# Altium schematic symbol library jlcpcb_2025_04_capacitors_extended_0603.schlib: 3668 symbols (part 5 of 20) (continued)
## 0603N750G500CT
designator C?  Capacitance: 75pF  (hidden comment: *)
Capacitor, Ceramic (MLCC), 75pF, ±2%, 50V, NP0, ±2%, SMD 0603; Manufacturer: Walsin Tech Corp; Manufacturer Part Number: 0603N750G500CT; Package Size: 0603; JLCPCB Basic Part: No; JLCPCB Part Number: C303829; Supplier 1: LCSC; Category: Capacitors - MLCC; Supplier Part Number 1: C303829; Tolerance: ±2%; Voltage Rating: 50V; Temperature Coefficient: NP0; RoHS: Yes; ComponentLink1Description: Datasheet; ComponentLink1URL: https://wmsc.lcsc.com/wmsc/upload/file/pdf/v2/lcsc/2304140030_Walsin-Tech-Corp-0603N750G500CT_C303829.pdf; ComponentLink2Description: JLCPCB Part URL; ComponentLink2URL: https://jlcpcb.com/partdetail/C303829; ComponentLink3Description: LCSC Part URL; ComponentLink3URL: https://lcsc.com/product-detail/Multilayer-Ceramic-Capacitors-MLCC---SMD-SMT_Walsin-Tech-Corp-Walsin-Tech-Corp-0603N750G500CT_C303829.html
footprint CAP-0603 (0603 (1608M) Capacitor)
pins: 1, 2

## 0603N751J500CT
designator C?  Capacitance: 750pF  (hidden comment: *)
Capacitor, Ceramic (MLCC), 750pF, ±5%, 50V, NP0, ±5%, SMD 0603; Manufacturer: Walsin Tech Corp; Manufacturer Part Number: 0603N751J500CT; Package Size: 0603; JLCPCB Basic Part: No; JLCPCB Part Number: C575469; Supplier 1: LCSC; Category: Capacitors - MLCC; Supplier Part Number 1: C575469; Tolerance: ±5%; Voltage Rating: 50V; Temperature Coefficient: NP0; RoHS: Yes; ComponentLink1Description: Datasheet; ComponentLink1URL: https://wmsc.lcsc.com/wmsc/upload/file/pdf/v2/lcsc/2304140030_Walsin-Tech-Corp-0603N751J500CT_C575469.pdf; ComponentLink2Description: JLCPCB Part URL; ComponentLink2URL: https://jlcpcb.com/partdetail/C575469; ComponentLink3Description: LCSC Part URL; ComponentLink3URL: https://lcsc.com/product-detail/Multilayer-Ceramic-Capacitors-MLCC---SMD-SMT_Walsin-Tech-Corp-Walsin-Tech-Corp-0603N751J500CT_C575469.html
footprint CAP-0603 (0603 (1608M) Capacitor)
pins: 1, 2

## 0603N820F101CT
designator C?  Capacitance: 82pF  (hidden comment: *)
Capacitor, Ceramic (MLCC), 82pF, ±1%, 100V, NP0, ±1%, SMD 0603; Manufacturer: Walsin Tech Corp; Manufacturer Part Number: 0603N820F101CT; Package Size: 0603; JLCPCB Basic Part: No; JLCPCB Part Number: C388063; Supplier 1: LCSC; Category: Capacitors - MLCC; Supplier Part Number 1: C388063; Tolerance: ±1%; Voltage Rating: 100V; Temperature Coefficient: NP0; RoHS: Yes; ComponentLink1Description: Datasheet; ComponentLink1URL: https://wmsc.lcsc.com/wmsc/upload/file/pdf/v2/lcsc/2304140030_Walsin-Tech-Corp-0603N820F101CT_C388063.pdf; ComponentLink2Description: JLCPCB Part URL; ComponentLink2URL: https://jlcpcb.com/partdetail/C388063; ComponentLink3Description: LCSC Part URL; ComponentLink3URL: https://lcsc.com/product-detail/Multilayer-Ceramic-Capacitors-MLCC---SMD-SMT_Walsin-Tech-Corp-Walsin-Tech-Corp-0603N820F101CT_C388063.html
footprint CAP-0603 (0603 (1608M) Capacitor)
pins: 1, 2

## 0603N820G500CT
designator C?  Capacitance: 82pF  (hidden comment: *)
Capacitor, Ceramic (MLCC), 82pF, ±2%, 50V, NP0, ±2%, SMD 0603; Manufacturer: Walsin Tech Corp; Manufacturer Part Number: 0603N820G500CT; Package Size: 0603; JLCPCB Basic Part: No; JLCPCB Part Number: C388064; Supplier 1: LCSC; Category: Capacitors - MLCC; Supplier Part Number 1: C388064; Tolerance: ±2%; Voltage Rating: 50V; Temperature Coefficient: NP0; RoHS: Yes; ComponentLink1Description: Datasheet; ComponentLink1URL: https://wmsc.lcsc.com/wmsc/upload/file/pdf/v2/lcsc/2304140030_Walsin-Tech-Corp-0603N820G500CT_C388064.pdf; ComponentLink2Description: JLCPCB Part URL; ComponentLink2URL: https://jlcpcb.com/partdetail/C388064; ComponentLink3Description: LCSC Part URL; ComponentLink3URL: https://lcsc.com/product-detail/Multilayer-Ceramic-Capacitors-MLCC---SMD-SMT_Walsin-Tech-Corp-Walsin-Tech-Corp-0603N820G500CT_C388064.html
footprint CAP-0603 (0603 (1608M) Capacitor)
pins: 1, 2

## 0603N820J251CT
designator C?  Capacitance: 82pF  (hidden comment: *)
Capacitor, Ceramic (MLCC), 82pF, ±5%, 250V, NP0, ±5%, SMD 0603; Manufacturer: Walsin Tech Corp; Manufacturer Part Number: 0603N820J251CT; Package Size: 0603; JLCPCB Basic Part: No; JLCPCB Part Number: C388065; Supplier 1: LCSC; Category: Capacitors - MLCC; Supplier Part Number 1: C388065; Tolerance: ±5%; Voltage Rating: 250V; Temperature Coefficient: NP0; RoHS: Yes; ComponentLink1Description: Datasheet; ComponentLink1URL: https://wmsc.lcsc.com/wmsc/upload/file/pdf/v2/lcsc/2304140030_Walsin-Tech-Corp-0603N820J251CT_C388065.pdf; ComponentLink2Description: JLCPCB Part URL; ComponentLink2URL: https://jlcpcb.com/partdetail/C388065; ComponentLink3Description: LCSC Part URL; ComponentLink3URL: https://lcsc.com/product-detail/Multilayer-Ceramic-Capacitors-MLCC---SMD-SMT_Walsin-Tech-Corp-Walsin-Tech-Corp-0603N820J251CT_C388065.html
footprint CAP-0603 (0603 (1608M) Capacitor)
pins: 1, 2

## 0603N820J500CT
designator C?  Capacitance: 82pF  (hidden comment: *)
Capacitor, Ceramic (MLCC), 82pF, ±5%, 50V, NP0, ±5%, SMD 0603; Manufacturer: Walsin Tech Corp; Manufacturer Part Number: 0603N820J500CT; Package Size: 0603; JLCPCB Basic Part: No; JLCPCB Part Number: C314304; Supplier 1: LCSC; Category: Capacitors - MLCC; Supplier Part Number 1: C314304; Tolerance: ±5%; Voltage Rating: 50V; Temperature Coefficient: NP0; RoHS: Yes; ComponentLink1Description: Datasheet; ComponentLink1URL: https://wmsc.lcsc.com/wmsc/upload/file/pdf/v2/lcsc/2304140030_Walsin-Tech-Corp-0603N820J500CT_C314304.pdf; ComponentLink2Description: JLCPCB Part URL; ComponentLink2URL: https://jlcpcb.com/partdetail/C314304; ComponentLink3Description: LCSC Part URL; ComponentLink3URL: https://lcsc.com/product-detail/Multilayer-Ceramic-Capacitors-MLCC---SMD-SMT_Walsin-Tech-Corp-Walsin-Tech-Corp-0603N820J500CT_C314304.html
footprint CAP-0603 (0603 (1608M) Capacitor)
pins: 1, 2

## 0603N820K500CT
designator C?  Capacitance: 82pF  (hidden comment: *)
Capacitor, Ceramic (MLCC), 82pF, ±10%, 50V, NP0, ±10%, SMD 0603; Manufacturer: Walsin Tech Corp; Manufacturer Part Number: 0603N820K500CT; Package Size: 0603; JLCPCB Basic Part: No; JLCPCB Part Number: C296069; Supplier 1: LCSC; Category: Capacitors - MLCC; Supplier Part Number 1: C296069; Tolerance: ±10%; Voltage Rating: 50V; Temperature Coefficient: NP0; RoHS: Yes; ComponentLink1Description: Datasheet; ComponentLink1URL: https://wmsc.lcsc.com/wmsc/upload/file/pdf/v2/lcsc/2304140030_Walsin-Tech-Corp-0603N820K500CT_C296069.pdf; ComponentLink2Description: JLCPCB Part URL; ComponentLink2URL: https://jlcpcb.com/partdetail/C296069; ComponentLink3Description: LCSC Part URL; ComponentLink3URL: https://lcsc.com/product-detail/Multilayer-Ceramic-Capacitors-MLCC---SMD-SMT_Walsin-Tech-Corp-Walsin-Tech-Corp-0603N820K500CT_C296069.html
footprint CAP-0603 (0603 (1608M) Capacitor)
pins: 1, 2

## 0603N821F500CT
designator C?  Capacitance: 820pF  (hidden comment: *)
Capacitor, Ceramic (MLCC), 820pF, ±1%, 50V, C0G, ±1%, SMD 0603; Manufacturer: Walsin Tech Corp; Manufacturer Part Number: 0603N821F500CT; Package Size: 0603; JLCPCB Basic Part: No; JLCPCB Part Number: C3888649; Supplier 1: LCSC; Category: Capacitors - MLCC; Supplier Part Number 1: C3888649; Tolerance: ±1%; Voltage Rating: 50V; Temperature Coefficient: C0G; RoHS: Yes; ComponentLink1Description: Datasheet; ComponentLink1URL: https://wmsc.lcsc.com/wmsc/upload/file/pdf/v2/lcsc/2309201536_Walsin-Tech-Corp-0603N821F500CT_C3888649.pdf; ComponentLink2Description: JLCPCB Part URL; ComponentLink2URL: https://jlcpcb.com/partdetail/C3888649; ComponentLink3Description: LCSC Part URL; ComponentLink3URL: https://lcsc.com/product-detail/Multilayer-Ceramic-Capacitors-MLCC---SMD-SMT_Walsin-Tech-Corp-Walsin-Tech-Corp-0603N821F500CT_C3888649.html
footprint CAP-0603 (0603 (1608M) Capacitor)
pins: 1, 2

## 0603N821J500CT
designator C?  Capacitance: 820pF  (hidden comment: *)
Capacitor, Ceramic (MLCC), 820pF, ±5%, 50V, NP0, ±5%, SMD 0603; Manufacturer: Walsin Tech Corp; Manufacturer Part Number: 0603N821J500CT; Package Size: 0603; JLCPCB Basic Part: No; JLCPCB Part Number: C237237; Supplier 1: LCSC; Category: Capacitors - MLCC; Supplier Part Number 1: C237237; Tolerance: ±5%; Voltage Rating: 50V; Temperature Coefficient: NP0; RoHS: Yes; ComponentLink1Description: Datasheet; ComponentLink1URL: https://wmsc.lcsc.com/wmsc/upload/file/pdf/v2/lcsc/2304140030_Walsin-Tech-Corp-0603N821J500CT_C237237.pdf; ComponentLink2Description: JLCPCB Part URL; ComponentLink2URL: https://jlcpcb.com/partdetail/C237237; ComponentLink3Description: LCSC Part URL; ComponentLink3URL: https://lcsc.com/product-detail/Multilayer-Ceramic-Capacitors-MLCC---SMD-SMT_Walsin-Tech-Corp-Walsin-Tech-Corp-0603N821J500CT_C237237.html
footprint CAP-0603 (0603 (1608M) Capacitor)
pins: 1, 2

## 0603N911J500CT
designator C?  Capacitance: 910pF  (hidden comment: *)
Capacitor, Ceramic (MLCC), 910pF, ±5%, 50V, NP0, ±5%, SMD 0603; Manufacturer: Walsin Tech Corp; Manufacturer Part Number: 0603N911J500CT; Package Size: 0603; JLCPCB Basic Part: No; JLCPCB Part Number: C458911; Supplier 1: LCSC; Category: Capacitors - MLCC; Supplier Part Number 1: C458911; Tolerance: ±5%; Voltage Rating: 50V; Temperature Coefficient: NP0; RoHS: Yes; ComponentLink1Description: Datasheet; ComponentLink1URL: https://wmsc.lcsc.com/wmsc/upload/file/pdf/v2/lcsc/2304140030_Walsin-Tech-Corp-0603N911J500CT_C458911.pdf; ComponentLink2Description: JLCPCB Part URL; ComponentLink2URL: https://jlcpcb.com/partdetail/C458911; ComponentLink3Description: LCSC Part URL; ComponentLink3URL: https://lcsc.com/product-detail/Multilayer-Ceramic-Capacitors-MLCC---SMD-SMT_Walsin-Tech-Corp-Walsin-Tech-Corp-0603N911J500CT_C458911.html
footprint CAP-0603 (0603 (1608M) Capacitor)
pins: 1, 2

## 0603X105J6R3CT
designator C?  Capacitance: 1uF  (hidden comment: *)
Capacitor, Ceramic (MLCC), 1uF, ±5%, 6.3V, X5R, ±5%, SMD 0603; Manufacturer: Walsin Tech Corp; Manufacturer Part Number: 0603X105J6R3CT; Package Size: 0603; JLCPCB Basic Part: No; JLCPCB Part Number: C458914; Supplier 1: LCSC; Category: Capacitors - MLCC; Supplier Part Number 1: C458914; Tolerance: ±5%; Voltage Rating: 6.3V; Temperature Coefficient: X5R; RoHS: Yes; ComponentLink1Description: Datasheet; ComponentLink1URL: https://wmsc.lcsc.com/wmsc/upload/file/pdf/v2/lcsc/2304140030_Walsin-Tech-Corp-0603X105J6R3CT_C458914.pdf; ComponentLink2Description: JLCPCB Part URL; ComponentLink2URL: https://jlcpcb.com/partdetail/C458914; ComponentLink3Description: LCSC Part URL; ComponentLink3URL: https://lcsc.com/product-detail/Multilayer-Ceramic-Capacitors-MLCC---SMD-SMT_Walsin-Tech-Corp-Walsin-Tech-Corp-0603X105J6R3CT_C458914.html
footprint CAP-0603 (0603 (1608M) Capacitor)
pins: 1, 2

## 0603X105J100CT
designator C?  Capacitance: 1uF  (hidden comment: *)
Capacitor, Ceramic (MLCC), 1uF, ±5%, 10V, X5R, ±5%, SMD 0603; Manufacturer: Walsin Tech Corp; Manufacturer Part Number: 0603X105J100CT; Package Size: 0603; JLCPCB Basic Part: No; JLCPCB Part Number: C458912; Supplier 1: LCSC; Category: Capacitors - MLCC; Supplier Part Number 1: C458912; Tolerance: ±5%; Voltage Rating: 10V; Temperature Coefficient: X5R; RoHS: Yes; ComponentLink1Description: Datasheet; ComponentLink1URL: https://wmsc.lcsc.com/wmsc/upload/file/pdf/v2/lcsc/2304140030_Walsin-Tech-Corp-0603X105J100CT_C458912.pdf; ComponentLink2Description: JLCPCB Part URL; ComponentLink2URL: https://jlcpcb.com/partdetail/C458912; ComponentLink3Description: LCSC Part URL; ComponentLink3URL: https://lcsc.com/product-detail/Multilayer-Ceramic-Capacitors-MLCC---SMD-SMT_Walsin-Tech-Corp-Walsin-Tech-Corp-0603X105J100CT_C458912.html
footprint CAP-0603 (0603 (1608M) Capacitor)
pins: 1, 2

## 0603X105J160CT
designator C?  Capacitance: 1uF  (hidden comment: *)
Capacitor, Ceramic (MLCC), 1uF, ±5%, 16V, X5R, ±5%, SMD 0603; Manufacturer: Walsin Tech Corp; Manufacturer Part Number: 0603X105J160CT; Package Size: 0603; JLCPCB Basic Part: No; JLCPCB Part Number: C458913; Supplier 1: LCSC; Category: Capacitors - MLCC; Supplier Part Number 1: C458913; Tolerance: ±5%; Voltage Rating: 16V; Temperature Coefficient: X5R; RoHS: Yes; ComponentLink1Description: Datasheet; ComponentLink1URL: https://wmsc.lcsc.com/wmsc/upload/file/pdf/v2/lcsc/2304140030_Walsin-Tech-Corp-0603X105J160CT_C458913.pdf; ComponentLink2Description: JLCPCB Part URL; ComponentLink2URL: https://jlcpcb.com/partdetail/C458913; ComponentLink3Description: LCSC Part URL; ComponentLink3URL: https://lcsc.com/product-detail/Multilayer-Ceramic-Capacitors-MLCC---SMD-SMT_Walsin-Tech-Corp-Walsin-Tech-Corp-0603X105J160CT_C458913.html
footprint CAP-0603 (0603 (1608M) Capacitor)
pins: 1, 2

## 0603X105K6R3CT
designator C?  Capacitance: 1uF  (hidden comment: *)
Capacitor, Ceramic (MLCC), 1uF, ±10%, 6.3V, X5R, ±10%, SMD 0603; Manufacturer: Walsin Tech Corp; Manufacturer Part Number: 0603X105K6R3CT; Package Size: 0603; JLCPCB Basic Part: No; JLCPCB Part Number: C152900; Supplier 1: LCSC; Category: Capacitors - MLCC; Supplier Part Number 1: C152900; Tolerance: ±10%; Voltage Rating: 6.3V; Temperature Coefficient: X5R; RoHS: Yes; ComponentLink1Description: Datasheet; ComponentLink1URL: https://wmsc.lcsc.com/wmsc/upload/file/pdf/v2/lcsc/2304140030_Walsin-Tech-Corp-0603X105K6R3CT_C152900.pdf; ComponentLink2Description: JLCPCB Part URL; ComponentLink2URL: https://jlcpcb.com/partdetail/C152900; ComponentLink3Description: LCSC Part URL; ComponentLink3URL: https://lcsc.com/product-detail/Multilayer-Ceramic-Capacitors-MLCC---SMD-SMT_Walsin-Tech-Corp-Walsin-Tech-Corp-0603X105K6R3CT_C152900.html
footprint CAP-0603 (0603 (1608M) Capacitor)
pins: 1, 2

## 0603X105K100CT
designator C?  Capacitance: 1uF  (hidden comment: *)
Capacitor, Ceramic (MLCC), 1uF, ±10%, 10V, X5R, ±10%, SMD 0603; Manufacturer: Walsin Tech Corp; Manufacturer Part Number: 0603X105K100CT; Package Size: 0603; JLCPCB Basic Part: No; JLCPCB Part Number: C83059; Supplier 1: LCSC; Category: Capacitors - MLCC; Supplier Part Number 1: C83059; Tolerance: ±10%; Voltage Rating: 10V; Temperature Coefficient: X5R; RoHS: Yes; ComponentLink1Description: Datasheet; ComponentLink1URL: https://wmsc.lcsc.com/wmsc/upload/file/pdf/v2/lcsc/1811151147_Walsin-Tech-Corp-0603X105K100CT_C83059.pdf; ComponentLink2Description: JLCPCB Part URL; ComponentLink2URL: https://jlcpcb.com/partdetail/C83059; ComponentLink3Description: LCSC Part URL; ComponentLink3URL: https://lcsc.com/product-detail/Multilayer-Ceramic-Capacitors-MLCC---SMD-SMT_Walsin-Tech-Corp-Walsin-Tech-Corp-0603X105K100CT_C83059.html
footprint CAP-0603 (0603 (1608M) Capacitor)
pins: 1, 2

## 0603X105K100NT
designator C?  Capacitance: 1uF  (hidden comment: *)
Capacitor, Ceramic (MLCC), 1uF, ±10%, 10V, X5R, ±10%, SMD 0603; Manufacturer: FH(Guangdong Fenghua Advanced Tech); Manufacturer Part Number: 0603X105K100NT; Package Size: 0603; JLCPCB Basic Part: No; JLCPCB Part Number: C111590; Supplier 1: LCSC; Category: Capacitors - MLCC; Supplier Part Number 1: C111590; Tolerance: ±10%; Voltage Rating: 10V; Temperature Coefficient: X5R; RoHS: Yes; ComponentLink1Description: Datasheet; ComponentLink1URL: https://wmsc.lcsc.com/wmsc/upload/file/pdf/v2/lcsc/2304140030_FH--Guangdong-Fenghua-Advanced-Tech-0603X105K100NT_C111590.pdf; ComponentLink2Description: JLCPCB Part URL; ComponentLink2URL: https://jlcpcb.com/partdetail/C111590; ComponentLink3Description: LCSC Part URL; ComponentLink3URL: https://lcsc.com/product-detail/Multilayer-Ceramic-Capacitors-MLCC---SMD-SMT_FH-Guangdong-Fenghua-Advanced-Tech-FH-Guangdong-Fenghua-Advanced-Tech-0603X105K100NT_C111590.html
footprint CAP-0603 (0603 (1608M) Capacitor)
pins: 1, 2

## 0603X105K160CT
designator C?  Capacitance: 1uF  (hidden comment: *)
Capacitor, Ceramic (MLCC), 1uF, ±10%, 16V, X5R, ±10%, SMD 0603; Manufacturer: Walsin Tech Corp; Manufacturer Part Number: 0603X105K160CT; Package Size: 0603; JLCPCB Basic Part: No; JLCPCB Part Number: C105504; Supplier 1: LCSC; Category: Capacitors - MLCC; Supplier Part Number 1: C105504; Tolerance: ±10%; Voltage Rating: 16V; Temperature Coefficient: X5R; RoHS: Yes; ComponentLink1Description: Datasheet; ComponentLink1URL: https://wmsc.lcsc.com/wmsc/upload/file/pdf/v2/lcsc/2304140030_Walsin-Tech-Corp-0603X105K160CT_C105504.pdf; ComponentLink2Description: JLCPCB Part URL; ComponentLink2URL: https://jlcpcb.com/partdetail/C105504; ComponentLink3Description: LCSC Part URL; ComponentLink3URL: https://lcsc.com/product-detail/Multilayer-Ceramic-Capacitors-MLCC---SMD-SMT_Walsin-Tech-Corp-Walsin-Tech-Corp-0603X105K160CT_C105504.html
footprint CAP-0603 (0603 (1608M) Capacitor)
pins: 1, 2

## 0603X105K160NT
designator C?  Capacitance: 1uF  (hidden comment: *)
Capacitor, Ceramic (MLCC), 1uF, ±10%, 16V, X5R, ±10%, SMD 0603; Manufacturer: FH(Guangdong Fenghua Advanced Tech); Manufacturer Part Number: 0603X105K160NT; Package Size: 0603; JLCPCB Basic Part: No; JLCPCB Part Number: C89188; Supplier 1: LCSC; Category: Capacitors - MLCC; Supplier Part Number 1: C89188; Tolerance: ±10%; Voltage Rating: 16V; Temperature Coefficient: X5R; RoHS: Yes; ComponentLink1Description: Datasheet; ComponentLink1URL: https://wmsc.lcsc.com/wmsc/upload/file/pdf/v2/lcsc/2304140030_FH--Guangdong-Fenghua-Advanced-Tech-0603X105K160NT_C89188.pdf; ComponentLink2Description: JLCPCB Part URL; ComponentLink2URL: https://jlcpcb.com/partdetail/C89188; ComponentLink3Description: LCSC Part URL; ComponentLink3URL: https://lcsc.com/product-detail/Multilayer-Ceramic-Capacitors-MLCC---SMD-SMT_FH-Guangdong-Fenghua-Advanced-Tech-FH-Guangdong-Fenghua-Advanced-Tech-0603X105K160NT_C89188.html
footprint CAP-0603 (0603 (1608M) Capacitor)
pins: 1, 2

## 0603X105K250CT
designator C?  Capacitance: 1uF  (hidden comment: *)
Capacitor, Ceramic (MLCC), 1uF, ±10%, 25V, X5R, ±10%, SMD 0603; Manufacturer: Walsin Tech Corp; Manufacturer Part Number: 0603X105K250CT; Package Size: 0603; JLCPCB Basic Part: No; JLCPCB Part Number: C93187; Supplier 1: LCSC; Category: Capacitors - MLCC; Supplier Part Number 1: C93187; Tolerance: ±10%; Voltage Rating: 25V; Temperature Coefficient: X5R; RoHS: Yes; ComponentLink1Description: Datasheet; ComponentLink1URL: https://wmsc.lcsc.com/wmsc/upload/file/pdf/v2/lcsc/2304140030_Walsin-Tech-Corp-0603X105K250CT_C93187.pdf; ComponentLink2Description: JLCPCB Part URL; ComponentLink2URL: https://jlcpcb.com/partdetail/C93187; ComponentLink3Description: LCSC Part URL; ComponentLink3URL: https://lcsc.com/product-detail/Multilayer-Ceramic-Capacitors-MLCC---SMD-SMT_Walsin-Tech-Corp-Walsin-Tech-Corp-0603X105K250CT_C93187.html
footprint CAP-0603 (0603 (1608M) Capacitor)
pins: 1, 2

## 0603X105K250NT
designator C?  Capacitance: 1uF  (hidden comment: *)
Capacitor, Ceramic (MLCC), 1uF, ±10%, 25V, X5R, ±10%, SMD 0603; Manufacturer: FH(Guangdong Fenghua Advanced Tech); Manufacturer Part Number: 0603X105K250NT; Package Size: 0603; JLCPCB Basic Part: No; JLCPCB Part Number: C89376; Supplier 1: LCSC; Category: Capacitors - MLCC; Supplier Part Number 1: C89376; Tolerance: ±10%; Voltage Rating: 25V; Temperature Coefficient: X5R; RoHS: Yes; ComponentLink1Description: Datasheet; ComponentLink1URL: https://wmsc.lcsc.com/wmsc/upload/file/pdf/v2/lcsc/2304140030_FH--Guangdong-Fenghua-Advanced-Tech-0603X105K250NT_C89376.pdf; ComponentLink2Description: JLCPCB Part URL; ComponentLink2URL: https://jlcpcb.com/partdetail/C89376; ComponentLink3Description: LCSC Part URL; ComponentLink3URL: https://lcsc.com/product-detail/Multilayer-Ceramic-Capacitors-MLCC---SMD-SMT_FH-Guangdong-Fenghua-Advanced-Tech-FH-Guangdong-Fenghua-Advanced-Tech-0603X105K250NT_C89376.html
footprint CAP-0603 (0603 (1608M) Capacitor)
pins: 1, 2

## 0603X105K500CT
designator C?  Capacitance: 1uF  (hidden comment: *)
Capacitor, Ceramic (MLCC), 1uF, ±10%, 50V, X5R, ±10%, SMD 0603; Manufacturer: Walsin Tech Corp; Manufacturer Part Number: 0603X105K500CT; Package Size: 0603; JLCPCB Basic Part: No; JLCPCB Part Number: C141872; Supplier 1: LCSC; Category: Capacitors - MLCC; Supplier Part Number 1: C141872; Tolerance: ±10%; Voltage Rating: 50V; Temperature Coefficient: X5R; RoHS: Yes; ComponentLink1Description: Datasheet; ComponentLink1URL: https://wmsc.lcsc.com/wmsc/upload/file/pdf/v2/lcsc/2304140030_Walsin-Tech-Corp-0603X105K500CT_C141872.pdf; ComponentLink2Description: JLCPCB Part URL; ComponentLink2URL: https://jlcpcb.com/partdetail/C141872; ComponentLink3Description: LCSC Part URL; ComponentLink3URL: https://lcsc.com/product-detail/Multilayer-Ceramic-Capacitors-MLCC---SMD-SMT_Walsin-Tech-Corp-Walsin-Tech-Corp-0603X105K500CT_C141872.html
footprint CAP-0603 (0603 (1608M) Capacitor)
pins: 1, 2

## 0603X105K500NT
designator C?  Capacitance: 1uF  (hidden comment: *)
Capacitor, Ceramic (MLCC), 1uF, ±10%, 50V, X5R, ±10%, SMD 0603; Manufacturer: FH(Guangdong Fenghua Advanced Tech); Manufacturer Part Number: 0603X105K500NT; Package Size: 0603; JLCPCB Basic Part: No; JLCPCB Part Number: C157684; Supplier 1: LCSC; Category: Capacitors - MLCC; Supplier Part Number 1: C157684; Tolerance: ±10%; Voltage Rating: 50V; Temperature Coefficient: X5R; RoHS: Yes; ComponentLink1Description: Datasheet; ComponentLink1URL: https://wmsc.lcsc.com/wmsc/upload/file/pdf/v2/lcsc/2304140030_FH--Guangdong-Fenghua-Advanced-Tech-0603X105K500NT_C157684.pdf; ComponentLink2Description: JLCPCB Part URL; ComponentLink2URL: https://jlcpcb.com/partdetail/C157684; ComponentLink3Description: LCSC Part URL; ComponentLink3URL: https://lcsc.com/product-detail/Multilayer-Ceramic-Capacitors-MLCC---SMD-SMT_FH-Guangdong-Fenghua-Advanced-Tech-FH-Guangdong-Fenghua-Advanced-Tech-0603X105K500NT_C157684.html
footprint CAP-0603 (0603 (1608M) Capacitor)
pins: 1, 2

## 0603X105M100NT
designator C?  Capacitance: 1uF  (hidden comment: *)
Capacitor, Ceramic (MLCC), 1uF, 10V, SMD 0603; Manufacturer: FH (Guangdong Fenghua Advanced Tech); Manufacturer Part Number: 0603X105M100NT; Package Size: 0603; JLCPCB Basic Part: No; JLCPCB Part Number: C2857984; Supplier 1: LCSC; Category: Capacitors - MLCC; Supplier Part Number 1: C2857984; Voltage Rating: 10V; RoHS: Yes; ComponentLink1Description: Datasheet; ComponentLink2Description: JLCPCB Part URL; ComponentLink2URL: https://jlcpcb.com/partdetail/C2857984; ComponentLink3Description: LCSC Part URL; ComponentLink3URL: https://lcsc.com/product-detail/Multilayer-Ceramic-Capacitors-MLCC---SMD-SMT_FH-Guangdong-Fenghua-Advanced-Tech-FH-Guangdong-Fenghua-Advanced-Tech-0603X105M100NT_C2857984.html
footprint CAP-0603 (0603 (1608M) Capacitor)
pins: 1, 2

## 0603X105M160NT
designator C?  Capacitance: 1uF  (hidden comment: *)
Capacitor, Ceramic (MLCC), 1uF, ±20%, 16V, X5R, ±20%, SMD 0603; Manufacturer: FH(Guangdong Fenghua Advanced Tech); Manufacturer Part Number: 0603X105M160NT; Package Size: 0603; JLCPCB Basic Part: No; JLCPCB Part Number: C303884; Supplier 1: LCSC; Category: Capacitors - MLCC; Supplier Part Number 1: C303884; Tolerance: ±20%; Voltage Rating: 16V; Temperature Coefficient: X5R; RoHS: Yes; ComponentLink1Description: Datasheet; ComponentLink1URL: https://wmsc.lcsc.com/wmsc/upload/file/pdf/v2/lcsc/2304140030_FH--Guangdong-Fenghua-Advanced-Tech-0603X105M160NT_C303884.pdf; ComponentLink2Description: JLCPCB Part URL; ComponentLink2URL: https://jlcpcb.com/partdetail/C303884; ComponentLink3Description: LCSC Part URL; ComponentLink3URL: https://lcsc.com/product-detail/Multilayer-Ceramic-Capacitors-MLCC---SMD-SMT_FH-Guangdong-Fenghua-Advanced-Tech-FH-Guangdong-Fenghua-Advanced-Tech-0603X105M160NT_C303884.html
footprint CAP-0603 (0603 (1608M) Capacitor)
pins: 1, 2

## 0603X105M250NT
designator C?  Capacitance: 1000000pF  (hidden comment: *)
Capacitor, Ceramic (MLCC), 1000000pF, ±20%, 25V, X5R, ±20%, SMD 0603; Manufacturer: FH (Guangdong Fenghua Advanced Tech); Manufacturer Part Number: 0603X105M250NT; Package Size: 0603; JLCPCB Basic Part: No; JLCPCB Part Number: C2857985; Supplier 1: LCSC; Category: Capacitors - MLCC; Supplier Part Number 1: C2857985; Tolerance: ±20%; Voltage Rating: 25V; Temperature Coefficient: X5R; RoHS: Yes; ComponentLink1Description: Datasheet; ComponentLink2Description: JLCPCB Part URL; ComponentLink2URL: https://jlcpcb.com/partdetail/C2857985; ComponentLink3Description: LCSC Part URL; ComponentLink3URL: https://lcsc.com/product-detail/Multilayer-Ceramic-Capacitors-MLCC---SMD-SMT_FH-Guangdong-Fenghua-Advanced-Tech-FH-Guangdong-Fenghua-Advanced-Tech-0603X105M250NT_C2857985.html
footprint CAP-0603 (0603 (1608M) Capacitor)
pins: 1, 2

## 0603X106K6R3CT
designator C?  Capacitance: 10uF  (hidden comment: *)
Capacitor, Ceramic (MLCC), 10uF, ±10%, 6.3V, X5R, ±10%, SMD 0603; Manufacturer: Walsin Tech Corp; Manufacturer Part Number: 0603X106K6R3CT; Package Size: 0603; JLCPCB Basic Part: No; JLCPCB Part Number: C123607; Supplier 1: LCSC; Category: Capacitors - MLCC; Supplier Part Number 1: C123607; Tolerance: ±10%; Voltage Rating: 6.3V; Temperature Coefficient: X5R; RoHS: Yes; ComponentLink1Description: Datasheet; ComponentLink1URL: https://wmsc.lcsc.com/wmsc/upload/file/pdf/v2/lcsc/2304140030_Walsin-Tech-Corp-0603X106K6R3CT_C123607.pdf; ComponentLink2Description: JLCPCB Part URL; ComponentLink2URL: https://jlcpcb.com/partdetail/C123607; ComponentLink3Description: LCSC Part URL; ComponentLink3URL: https://lcsc.com/product-detail/Multilayer-Ceramic-Capacitors-MLCC---SMD-SMT_Walsin-Tech-Corp-Walsin-Tech-Corp-0603X106K6R3CT_C123607.html
footprint CAP-0603 (0603 (1608M) Capacitor)
pins: 1, 2

## 0603X106K6R3NT
designator C?  Capacitance: 10uF  (hidden comment: *)
Capacitor, Ceramic (MLCC), 10uF, ±10%, 6.3V, X5R, ±10%, SMD 0603; Manufacturer: FH(Guangdong Fenghua Advanced Tech); Manufacturer Part Number: 0603X106K6R3NT; Package Size: 0603; JLCPCB Basic Part: No; JLCPCB Part Number: C99231; Supplier 1: LCSC; Category: Capacitors - MLCC; Supplier Part Number 1: C99231; Tolerance: ±10%; Voltage Rating: 6.3V; Temperature Coefficient: X5R; RoHS: Yes; ComponentLink1Description: Datasheet; ComponentLink1URL: https://wmsc.lcsc.com/wmsc/upload/file/pdf/v2/lcsc/2304140030_FH--Guangdong-Fenghua-Advanced-Tech-0603X106K6R3NT_C99231.pdf; ComponentLink2Description: JLCPCB Part URL; ComponentLink2URL: https://jlcpcb.com/partdetail/C99231; ComponentLink3Description: LCSC Part URL; ComponentLink3URL: https://lcsc.com/product-detail/Multilayer-Ceramic-Capacitors-MLCC---SMD-SMT_FH-Guangdong-Fenghua-Advanced-Tech-FH-Guangdong-Fenghua-Advanced-Tech-0603X106K6R3NT_C99231.html
footprint CAP-0603 (0603 (1608M) Capacitor)
pins: 1, 2

## 0603X106K100
designator C?  Capacitance: 10uF  (hidden comment: *)
Capacitor, Ceramic (MLCC), 10uF, ±10%, 10V, X5R, ±10%, SMD 0603; Manufacturer: Walsin Tech Corp; Manufacturer Part Number: 0603X106K100; Package Size: 0603; JLCPCB Basic Part: No; JLCPCB Part Number: C90806; Supplier 1: LCSC; Category: Capacitors - MLCC; Supplier Part Number 1: C90806; Tolerance: ±10%; Voltage Rating: 10V; Temperature Coefficient: X5R; RoHS: Yes; ComponentLink1Description: Datasheet; ComponentLink1URL: https://wmsc.lcsc.com/wmsc/upload/file/pdf/v2/lcsc/2304140030_Walsin-Tech-Corp-0603X106K100_C90806.pdf; ComponentLink2Description: JLCPCB Part URL; ComponentLink2URL: https://jlcpcb.com/partdetail/C90806; ComponentLink3Description: LCSC Part URL; ComponentLink3URL: https://lcsc.com/product-detail/Multilayer-Ceramic-Capacitors-MLCC---SMD-SMT_Walsin-Tech-Corp-Walsin-Tech-Corp-0603X106K100_C90806.html
footprint CAP-0603 (0603 (1608M) Capacitor)
pins: 1, 2

## 0603X106K100CT
designator C?  Capacitance: 10uF  (hidden comment: *)
Capacitor, Ceramic (MLCC), 10uF, ±10%, X5R, ±10%, SMD 0603; Manufacturer: Walsin Tech Corp; Manufacturer Part Number: 0603X106K100CT; Package Size: 0603; JLCPCB Basic Part: No; JLCPCB Part Number: C2840513; Supplier 1: LCSC; Category: Capacitors - MLCC; Supplier Part Number 1: C2840513; Tolerance: ±10%; Temperature Coefficient: X5R; RoHS: Yes; ComponentLink1Description: Datasheet; ComponentLink1URL: https://wmsc.lcsc.com/wmsc/upload/file/pdf/v2/lcsc/2207081830_Walsin-Tech-Corp-0603X106K100CT_C2840513.pdf; ComponentLink2Description: JLCPCB Part URL; ComponentLink2URL: https://jlcpcb.com/partdetail/C2840513; ComponentLink3Description: LCSC Part URL; ComponentLink3URL: https://lcsc.com/product-detail/Multilayer-Ceramic-Capacitors-MLCC---SMD-SMT_Walsin-Tech-Corp-Walsin-Tech-Corp-0603X106K100CT_C2840513.html
footprint CAP-0603 (0603 (1608M) Capacitor)
pins: 1, 2

## 0603X106K100NT
designator C?  Capacitance: 10uF  (hidden comment: *)
Capacitor, Ceramic (MLCC), 10uF, ±10%, 10V, X5R, ±10%, SMD 0603; Manufacturer: FH(Guangdong Fenghua Advanced Tech); Manufacturer Part Number: 0603X106K100NT; Package Size: 0603; JLCPCB Basic Part: No; JLCPCB Part Number: C38898; Supplier 1: LCSC; Category: Capacitors - MLCC; Supplier Part Number 1: C38898; Tolerance: ±10%; Voltage Rating: 10V; Temperature Coefficient: X5R; RoHS: Yes; ComponentLink1Description: Datasheet; ComponentLink1URL: https://wmsc.lcsc.com/wmsc/upload/file/pdf/v2/lcsc/2304140030_FH--Guangdong-Fenghua-Advanced-Tech-0603X106K100NT_C38898.pdf; ComponentLink2Description: JLCPCB Part URL; ComponentLink2URL: https://jlcpcb.com/partdetail/C38898; ComponentLink3Description: LCSC Part URL; ComponentLink3URL: https://lcsc.com/product-detail/Multilayer-Ceramic-Capacitors-MLCC---SMD-SMT_FH-Guangdong-Fenghua-Advanced-Tech-FH-Guangdong-Fenghua-Advanced-Tech-0603X106K100NT_C38898.html
footprint CAP-0603 (0603 (1608M) Capacitor)
pins: 1, 2

## 0603X106K160NT
designator C?  Capacitance: 10uF  (hidden comment: *)
Capacitor, Ceramic (MLCC), 10uF, ±10%, 16V, X5R, ±10%, SMD 0603; Manufacturer: FH(Guangdong Fenghua Advanced Tech); Manufacturer Part Number: 0603X106K160NT; Package Size: 0603; JLCPCB Basic Part: No; JLCPCB Part Number: C70225; Supplier 1: LCSC; Category: Capacitors - MLCC; Supplier Part Number 1: C70225; Tolerance: ±10%; Voltage Rating: 16V; Temperature Coefficient: X5R; RoHS: Yes; ComponentLink1Description: Datasheet; ComponentLink1URL: https://wmsc.lcsc.com/wmsc/upload/file/pdf/v2/lcsc/2304121200_FH--Guangdong-Fenghua-Advanced-Tech-0603X106K160NT_C70225.pdf; ComponentLink2Description: JLCPCB Part URL; ComponentLink2URL: https://jlcpcb.com/partdetail/C70225; ComponentLink3Description: LCSC Part URL; ComponentLink3URL: https://lcsc.com/product-detail/Multilayer-Ceramic-Capacitors-MLCC---SMD-SMT_FH-Guangdong-Fenghua-Advanced-Tech-FH-Guangdong-Fenghua-Advanced-Tech-0603X106K160NT_C70225.html
footprint CAP-0603 (0603 (1608M) Capacitor)
pins: 1, 2

## 0603X106M6R3CT
designator C?  Capacitance: 10uF  (hidden comment: *)
Capacitor, Ceramic (MLCC), 10uF, ±20%, 6.3V, X5R, ±20%, SMD 0603; Manufacturer: Walsin Tech Corp; Manufacturer Part Number: 0603X106M6R3CT; Package Size: 0603; JLCPCB Basic Part: No; JLCPCB Part Number: C123608; Supplier 1: LCSC; Category: Capacitors - MLCC; Supplier Part Number 1: C123608; Tolerance: ±20%; Voltage Rating: 6.3V; Temperature Coefficient: X5R; RoHS: Yes; ComponentLink1Description: Datasheet; ComponentLink1URL: https://wmsc.lcsc.com/wmsc/upload/file/pdf/v2/lcsc/2304140030_Walsin-Tech-Corp-0603X106M6R3CT_C123608.pdf; ComponentLink2Description: JLCPCB Part URL; ComponentLink2URL: https://jlcpcb.com/partdetail/C123608; ComponentLink3Description: LCSC Part URL; ComponentLink3URL: https://lcsc.com/product-detail/Multilayer-Ceramic-Capacitors-MLCC---SMD-SMT_Walsin-Tech-Corp-Walsin-Tech-Corp-0603X106M6R3CT_C123608.html
footprint CAP-0603 (0603 (1608M) Capacitor)
pins: 1, 2

## 0603X106M6R3NT
designator C?  Capacitance: 10uF  (hidden comment: *)
Capacitor, Ceramic (MLCC), 10uF, ±20%, 6.3V, X5R, ±20%, SMD 0603; Manufacturer: FH(Guangdong Fenghua Advanced Tech); Manufacturer Part Number: 0603X106M6R3NT; Package Size: 0603; JLCPCB Basic Part: No; JLCPCB Part Number: C105490; Supplier 1: LCSC; Category: Capacitors - MLCC; Supplier Part Number 1: C105490; Tolerance: ±20%; Voltage Rating: 6.3V; Temperature Coefficient: X5R; RoHS: Yes; ComponentLink1Description: Datasheet; ComponentLink1URL: https://wmsc.lcsc.com/wmsc/upload/file/pdf/v2/lcsc/2304140030_FH--Guangdong-Fenghua-Advanced-Tech-0603X106M6R3NT_C105490.pdf; ComponentLink2Description: JLCPCB Part URL; ComponentLink2URL: https://jlcpcb.com/partdetail/C105490; ComponentLink3Description: LCSC Part URL; ComponentLink3URL: https://lcsc.com/product-detail/Multilayer-Ceramic-Capacitors-MLCC---SMD-SMT_FH-Guangdong-Fenghua-Advanced-Tech-FH-Guangdong-Fenghua-Advanced-Tech-0603X106M6R3NT_C105490.html
footprint CAP-0603 (0603 (1608M) Capacitor)
pins: 1, 2

## 0603X106M100CT
designator C?  Capacitance: 10uF  (hidden comment: *)
Capacitor, Ceramic (MLCC), 10uF, ±20%, 10V, X5R, ±20%, SMD 0603; Manufacturer: Walsin Tech Corp; Manufacturer Part Number: 0603X106M100CT; Package Size: 0603; JLCPCB Basic Part: No; JLCPCB Part Number: C89283; Supplier 1: LCSC; Category: Capacitors - MLCC; Supplier Part Number 1: C89283; Tolerance: ±20%; Voltage Rating: 10V; Temperature Coefficient: X5R; RoHS: Yes; ComponentLink1Description: Datasheet; ComponentLink1URL: https://wmsc.lcsc.com/wmsc/upload/file/pdf/v2/lcsc/2304140030_Walsin-Tech-Corp-0603X106M100CT_C89283.pdf; ComponentLink2Description: JLCPCB Part URL; ComponentLink2URL: https://jlcpcb.com/partdetail/C89283; ComponentLink3Description: LCSC Part URL; ComponentLink3URL: https://lcsc.com/product-detail/Multilayer-Ceramic-Capacitors-MLCC---SMD-SMT_Walsin-Tech-Corp-Walsin-Tech-Corp-0603X106M100CT_C89283.html
footprint CAP-0603 (0603 (1608M) Capacitor)
pins: 1, 2

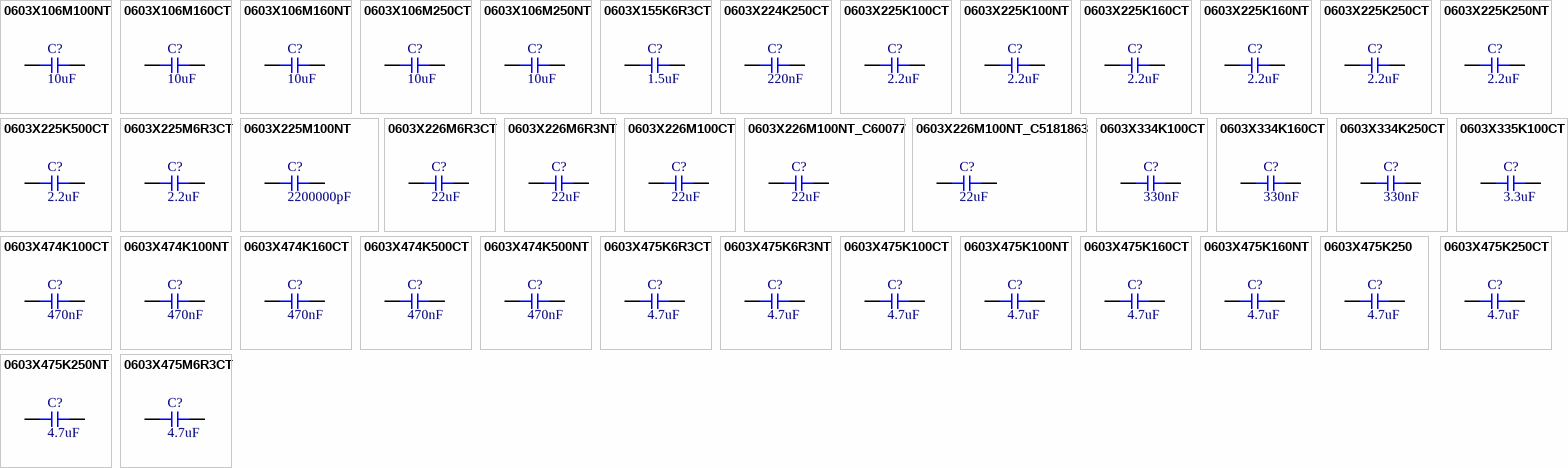
[diagram p20: symbols 0603X106M100NT to 0603X475M6R3CT]

## 0603X106M100NT
designator C?  Capacitance: 10uF  (hidden comment: *)
Capacitor, Ceramic (MLCC), 10uF, ±20%, 10V, X5R, ±20%, SMD 0603; Manufacturer: FH(Guangdong Fenghua Advanced Tech); Manufacturer Part Number: 0603X106M100NT; Package Size: 0603; JLCPCB Basic Part: No; JLCPCB Part Number: C91150; Supplier 1: LCSC; Category: Capacitors - MLCC; Supplier Part Number 1: C91150; Tolerance: ±20%; Voltage Rating: 10V; Temperature Coefficient: X5R; RoHS: Yes; ComponentLink1Description: Datasheet; ComponentLink1URL: https://wmsc.lcsc.com/wmsc/upload/file/pdf/v2/lcsc/2304140030_FH--Guangdong-Fenghua-Advanced-Tech-0603X106M100NT_C91150.pdf; ComponentLink2Description: JLCPCB Part URL; ComponentLink2URL: https://jlcpcb.com/partdetail/C91150; ComponentLink3Description: LCSC Part URL; ComponentLink3URL: https://lcsc.com/product-detail/Multilayer-Ceramic-Capacitors-MLCC---SMD-SMT_FH-Guangdong-Fenghua-Advanced-Tech-FH-Guangdong-Fenghua-Advanced-Tech-0603X106M100NT_C91150.html
footprint CAP-0603 (0603 (1608M) Capacitor)
pins: 1, 2

## 0603X106M160CT
designator C?  Capacitance: 10uF  (hidden comment: *)
Capacitor, Ceramic (MLCC), 10uF, ±20%, 16V, X5R, ±20%, SMD 0603; Manufacturer: Walsin Tech Corp; Manufacturer Part Number: 0603X106M160CT; Package Size: 0603; JLCPCB Basic Part: No; JLCPCB Part Number: C2909425; Supplier 1: LCSC; Category: Capacitors - MLCC; Supplier Part Number 1: C2909425; Tolerance: ±20%; Voltage Rating: 16V; Temperature Coefficient: X5R; RoHS: Yes; ComponentLink1Description: Datasheet; ComponentLink1URL: https://wmsc.lcsc.com/wmsc/upload/file/pdf/v2/lcsc/2110272130_Walsin-Tech-Corp-0603X106M160CT_C2909425.pdf; ComponentLink2Description: JLCPCB Part URL; ComponentLink2URL: https://jlcpcb.com/partdetail/C2909425; ComponentLink3Description: LCSC Part URL; ComponentLink3URL: https://lcsc.com/product-detail/Multilayer-Ceramic-Capacitors-MLCC---SMD-SMT_Walsin-Tech-Corp-Walsin-Tech-Corp-0603X106M160CT_C2909425.html
footprint CAP-0603 (0603 (1608M) Capacitor)
pins: 1, 2

## 0603X106M160NT
designator C?  Capacitance: 10uF  (hidden comment: *)
Capacitor, Ceramic (MLCC), 10uF, ±20%, 16V, X5R, ±20%, SMD 0603; Manufacturer: FH(Guangdong Fenghua Advanced Tech); Manufacturer Part Number: 0603X106M160NT; Package Size: 0603; JLCPCB Basic Part: No; JLCPCB Part Number: C108340; Supplier 1: LCSC; Category: Capacitors - MLCC; Supplier Part Number 1: C108340; Tolerance: ±20%; Voltage Rating: 16V; Temperature Coefficient: X5R; RoHS: Yes; ComponentLink1Description: Datasheet; ComponentLink1URL: https://wmsc.lcsc.com/wmsc/upload/file/pdf/v2/lcsc/2304140030_FH--Guangdong-Fenghua-Advanced-Tech-0603X106M160NT_C108340.pdf; ComponentLink2Description: JLCPCB Part URL; ComponentLink2URL: https://jlcpcb.com/partdetail/C108340; ComponentLink3Description: LCSC Part URL; ComponentLink3URL: https://lcsc.com/product-detail/Multilayer-Ceramic-Capacitors-MLCC---SMD-SMT_FH-Guangdong-Fenghua-Advanced-Tech-FH-Guangdong-Fenghua-Advanced-Tech-0603X106M160NT_C108340.html
footprint CAP-0603 (0603 (1608M) Capacitor)
pins: 1, 2

## 0603X106M250CT
designator C?  Capacitance: 10uF  (hidden comment: *)
Capacitor, Ceramic (MLCC), 10uF, ±20%, 25V, X5R, ±20%, SMD 0603; Manufacturer: Walsin Tech Corp; Manufacturer Part Number: 0603X106M250CT; Package Size: 0603; JLCPCB Basic Part: No; JLCPCB Part Number: C4555498; Supplier 1: LCSC; Category: Capacitors - MLCC; Supplier Part Number 1: C4555498; Tolerance: ±20%; Voltage Rating: 25V; Temperature Coefficient: X5R; RoHS: Yes; ComponentLink1Description: Datasheet; ComponentLink1URL: https://wmsc.lcsc.com/wmsc/upload/file/pdf/v2/lcsc/2207111830_Walsin-Tech-Corp-0603X106M250CT_C4555498.pdf; ComponentLink2Description: JLCPCB Part URL; ComponentLink2URL: https://jlcpcb.com/partdetail/C4555498; ComponentLink3Description: LCSC Part URL; ComponentLink3URL: https://lcsc.com/product-detail/Multilayer-Ceramic-Capacitors-MLCC---SMD-SMT_Walsin-Tech-Corp-Walsin-Tech-Corp-0603X106M250CT_C4555498.html
footprint CAP-0603 (0603 (1608M) Capacitor)
pins: 1, 2

## 0603X106M250NT
designator C?  Capacitance: 10uF  (hidden comment: *)
Capacitor, Ceramic (MLCC), 10uF, ±20%, 25V, X5R, ±20%, SMD 0603; Manufacturer: FH(Guangdong Fenghua Advanced Tech); Manufacturer Part Number: 0603X106M250NT; Package Size: 0603; JLCPCB Basic Part: No; JLCPCB Part Number: C479655; Supplier 1: LCSC; Category: Capacitors - MLCC; Supplier Part Number 1: C479655; Tolerance: ±20%; Voltage Rating: 25V; Temperature Coefficient: X5R; RoHS: Yes; ComponentLink1Description: Datasheet; ComponentLink1URL: https://wmsc.lcsc.com/wmsc/upload/file/pdf/v2/lcsc/2304140030_FH--Guangdong-Fenghua-Advanced-Tech-0603X106M250NT_C479655.pdf; ComponentLink2Description: JLCPCB Part URL; ComponentLink2URL: https://jlcpcb.com/partdetail/C479655; ComponentLink3Description: LCSC Part URL; ComponentLink3URL: https://lcsc.com/product-detail/Multilayer-Ceramic-Capacitors-MLCC---SMD-SMT_FH-Guangdong-Fenghua-Advanced-Tech-FH-Guangdong-Fenghua-Advanced-Tech-0603X106M250NT_C479655.html
footprint CAP-0603 (0603 (1608M) Capacitor)
pins: 1, 2

## 0603X155K6R3CT
designator C?  Capacitance: 1.5uF  (hidden comment: *)
Capacitor, Ceramic (MLCC), 1.5uF, ±10%, 6.3V, X5R, ±10%, SMD 0603; Manufacturer: Walsin Tech Corp; Manufacturer Part Number: 0603X155K6R3CT; Package Size: 0603; JLCPCB Basic Part: No; JLCPCB Part Number: C2909433; Supplier 1: LCSC; Category: Capacitors - MLCC; Supplier Part Number 1: C2909433; Tolerance: ±10%; Voltage Rating: 6.3V; Temperature Coefficient: X5R; RoHS: Yes; ComponentLink1Description: Datasheet; ComponentLink1URL: https://wmsc.lcsc.com/wmsc/upload/file/pdf/v2/lcsc/2110272130_Walsin-Tech-Corp-0603X155K6R3CT_C2909433.pdf; ComponentLink2Description: JLCPCB Part URL; ComponentLink2URL: https://jlcpcb.com/partdetail/C2909433; ComponentLink3Description: LCSC Part URL; ComponentLink3URL: https://lcsc.com/product-detail/Multilayer-Ceramic-Capacitors-MLCC---SMD-SMT_Walsin-Tech-Corp-Walsin-Tech-Corp-0603X155K6R3CT_C2909433.html
footprint CAP-0603 (0603 (1608M) Capacitor)
pins: 1, 2

## 0603X224K250CT
designator C?  Capacitance: 220nF  (hidden comment: *)
Capacitor, Ceramic (MLCC), 220nF, ±10%, 25V, X5R, ±10%, SMD 0603; Manufacturer: Walsin Tech Corp; Manufacturer Part Number: 0603X224K250CT; Package Size: 0603; JLCPCB Basic Part: No; JLCPCB Part Number: C388024; Supplier 1: LCSC; Category: Capacitors - MLCC; Supplier Part Number 1: C388024; Tolerance: ±10%; Voltage Rating: 25V; Temperature Coefficient: X5R; RoHS: Yes; ComponentLink1Description: Datasheet; ComponentLink1URL: https://wmsc.lcsc.com/wmsc/upload/file/pdf/v2/lcsc/2304140030_Walsin-Tech-Corp-0603X224K250CT_C388024.pdf; ComponentLink2Description: JLCPCB Part URL; ComponentLink2URL: https://jlcpcb.com/partdetail/C388024; ComponentLink3Description: LCSC Part URL; ComponentLink3URL: https://lcsc.com/product-detail/Multilayer-Ceramic-Capacitors-MLCC---SMD-SMT_Walsin-Tech-Corp-Walsin-Tech-Corp-0603X224K250CT_C388024.html
footprint CAP-0603 (0603 (1608M) Capacitor)
pins: 1, 2

## 0603X225K100CT
designator C?  Capacitance: 2.2uF  (hidden comment: *)
Capacitor, Ceramic (MLCC), 2.2uF, ±10%, 10V, X5R, ±10%, SMD 0603; Manufacturer: Walsin Tech Corp; Manufacturer Part Number: 0603X225K100CT; Package Size: 0603; JLCPCB Basic Part: No; JLCPCB Part Number: C123609; Supplier 1: LCSC; Category: Capacitors - MLCC; Supplier Part Number 1: C123609; Tolerance: ±10%; Voltage Rating: 10V; Temperature Coefficient: X5R; RoHS: Yes; ComponentLink1Description: Datasheet; ComponentLink1URL: https://wmsc.lcsc.com/wmsc/upload/file/pdf/v2/lcsc/2304140030_Walsin-Tech-Corp-0603X225K100CT_C123609.pdf; ComponentLink2Description: JLCPCB Part URL; ComponentLink2URL: https://jlcpcb.com/partdetail/C123609; ComponentLink3Description: LCSC Part URL; ComponentLink3URL: https://lcsc.com/product-detail/Multilayer-Ceramic-Capacitors-MLCC---SMD-SMT_Walsin-Tech-Corp-Walsin-Tech-Corp-0603X225K100CT_C123609.html
footprint CAP-0603 (0603 (1608M) Capacitor)
pins: 1, 2

## 0603X225K100NT
designator C?  Capacitance: 2.2uF  (hidden comment: *)
Capacitor, Ceramic (MLCC), 2.2uF, ±10%, 10V, X5R, ±10%, SMD 0603; Manufacturer: FH(Guangdong Fenghua Advanced Tech); Manufacturer Part Number: 0603X225K100NT; Package Size: 0603; JLCPCB Basic Part: No; JLCPCB Part Number: C167329; Supplier 1: LCSC; Category: Capacitors - MLCC; Supplier Part Number 1: C167329; Tolerance: ±10%; Voltage Rating: 10V; Temperature Coefficient: X5R; RoHS: Yes; ComponentLink1Description: Datasheet; ComponentLink1URL: https://wmsc.lcsc.com/wmsc/upload/file/pdf/v2/lcsc/2304140030_FH--Guangdong-Fenghua-Advanced-Tech-0603X225K100NT_C167329.pdf; ComponentLink2Description: JLCPCB Part URL; ComponentLink2URL: https://jlcpcb.com/partdetail/C167329; ComponentLink3Description: LCSC Part URL; ComponentLink3URL: https://lcsc.com/product-detail/Multilayer-Ceramic-Capacitors-MLCC---SMD-SMT_FH-Guangdong-Fenghua-Advanced-Tech-FH-Guangdong-Fenghua-Advanced-Tech-0603X225K100NT_C167329.html
footprint CAP-0603 (0603 (1608M) Capacitor)
pins: 1, 2

## 0603X225K160CT
designator C?  Capacitance: 2.2uF  (hidden comment: *)
Capacitor, Ceramic (MLCC), 2.2uF, ±10%, 16V, X5R, ±10%, SMD 0603; Manufacturer: Walsin Tech Corp; Manufacturer Part Number: 0603X225K160CT; Package Size: 0603; JLCPCB Basic Part: No; JLCPCB Part Number: C388025; Supplier 1: LCSC; Category: Capacitors - MLCC; Supplier Part Number 1: C388025; Tolerance: ±10%; Voltage Rating: 16V; Temperature Coefficient: X5R; RoHS: Yes; ComponentLink1Description: Datasheet; ComponentLink1URL: https://wmsc.lcsc.com/wmsc/upload/file/pdf/v2/lcsc/2304140030_Walsin-Tech-Corp-0603X225K160CT_C388025.pdf; ComponentLink2Description: JLCPCB Part URL; ComponentLink2URL: https://jlcpcb.com/partdetail/C388025; ComponentLink3Description: LCSC Part URL; ComponentLink3URL: https://lcsc.com/product-detail/Multilayer-Ceramic-Capacitors-MLCC---SMD-SMT_Walsin-Tech-Corp-Walsin-Tech-Corp-0603X225K160CT_C388025.html
footprint CAP-0603 (0603 (1608M) Capacitor)
pins: 1, 2

## 0603X225K160NT
designator C?  Capacitance: 2.2uF  (hidden comment: *)
Capacitor, Ceramic (MLCC), 2.2uF, ±10%, 16V, X5R, ±10%, SMD 0603; Manufacturer: FH(Guangdong Fenghua Advanced Tech); Manufacturer Part Number: 0603X225K160NT; Package Size: 0603; JLCPCB Basic Part: No; JLCPCB Part Number: C192431; Supplier 1: LCSC; Category: Capacitors - MLCC; Supplier Part Number 1: C192431; Tolerance: ±10%; Voltage Rating: 16V; Temperature Coefficient: X5R; RoHS: Yes; ComponentLink1Description: Datasheet; ComponentLink1URL: https://wmsc.lcsc.com/wmsc/upload/file/pdf/v2/lcsc/1811061720_FH--Guangdong-Fenghua-Advanced-Tech-0603X225K160NT_C192431.pdf; ComponentLink2Description: JLCPCB Part URL; ComponentLink2URL: https://jlcpcb.com/partdetail/C192431; ComponentLink3Description: LCSC Part URL; ComponentLink3URL: https://lcsc.com/product-detail/Multilayer-Ceramic-Capacitors-MLCC---SMD-SMT_FH-Guangdong-Fenghua-Advanced-Tech-FH-Guangdong-Fenghua-Advanced-Tech-0603X225K160NT_C192431.html
footprint CAP-0603 (0603 (1608M) Capacitor)
pins: 1, 2

## 0603X225K250CT
designator C?  Capacitance: 2.2uF  (hidden comment: *)
Capacitor, Ceramic (MLCC), 2.2uF, ±10%, 25V, X5R, ±10%, SMD 0603; Manufacturer: Walsin Tech Corp; Manufacturer Part Number: 0603X225K250CT; Package Size: 0603; JLCPCB Basic Part: No; JLCPCB Part Number: C237194; Supplier 1: LCSC; Category: Capacitors - MLCC; Supplier Part Number 1: C237194; Tolerance: ±10%; Voltage Rating: 25V; Temperature Coefficient: X5R; RoHS: Yes; ComponentLink1Description: Datasheet; ComponentLink1URL: https://wmsc.lcsc.com/wmsc/upload/file/pdf/v2/lcsc/2304140030_Walsin-Tech-Corp-0603X225K250CT_C237194.pdf; ComponentLink2Description: JLCPCB Part URL; ComponentLink2URL: https://jlcpcb.com/partdetail/C237194; ComponentLink3Description: LCSC Part URL; ComponentLink3URL: https://lcsc.com/product-detail/Multilayer-Ceramic-Capacitors-MLCC---SMD-SMT_Walsin-Tech-Corp-Walsin-Tech-Corp-0603X225K250CT_C237194.html
footprint CAP-0603 (0603 (1608M) Capacitor)
pins: 1, 2
